# Altium footprint library CONNECTOR_JUMPER.PcbLib: 25 footprints (part 2 of 2)
Each footprint in its own frame and in the unit in brackets; x right, y up, seen from the top. Pads: shape width x height; smd on the part's side, far side on the other; paste and mask are expansions set on the pad; w line width, h text height; cw(c..) or ccw(c..) is an arc to the next point about the centre after c.
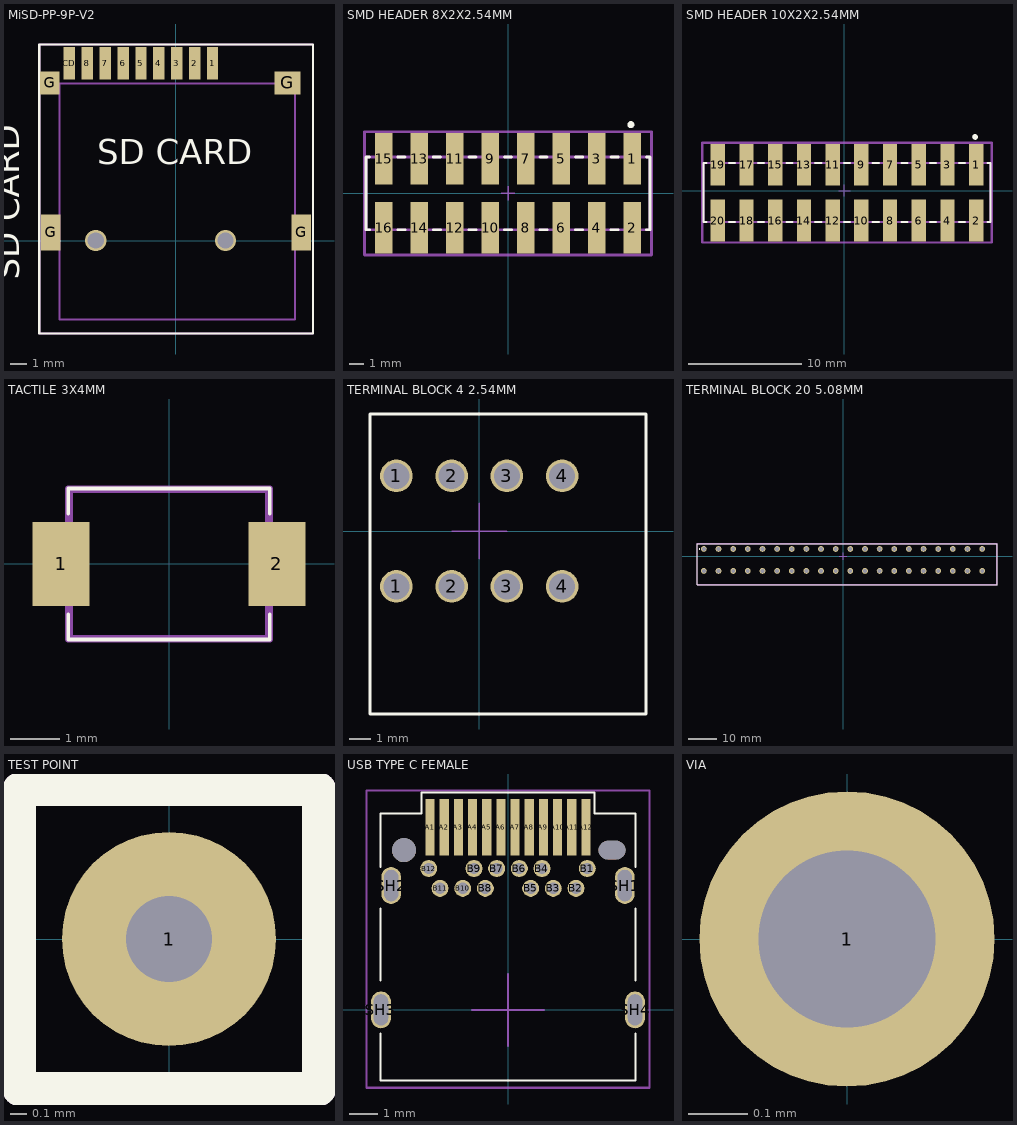
[diagram p1: the footprints below, top view; thin cyan lines are the x and y axes]

## MiSD-PP-9P-V2 [mm] "SD CARD"
pads (13):
  rect 0.7x2 smd mask+0.05: 1(2.25,10.9) 2(1.15,10.9) 3(0.05,10.9) 4(-1.05,10.9) 5(-2.15,10.9) 6(-3.25,10.9) 7(-4.35,10.9) 8(-5.45,10.9) CD(-6.55,10.9)
  rect 1.2x1.4 smd mask+0.05: G(-7.75,9.7)
  rect 1.2x2.2 smd mask+0.05: G(-7.7,0.5) G(7.7,0.5)
  rect 1.6x1.4 smd mask+0.05: G(6.85,9.7)
via 3.05,0 diameter 1.3 hole 1
via -4.93,0 diameter 1.3 hole 1
Top Overlay:
  lines w0.127: -8.407,-5.715 8.433,-5.715 8.433,12.065 -8.407,12.065 -8.407,-5.715
  text "SD CARD" at -4.826,4.699 h1.52
  text "SD CARD" at -9.652,-2.413 h1.52
Top 3D Body:
  lines w0.127: -7.163,-4.848 7.315,-4.848 7.315,9.652 -7.163,9.652 -7.163,-4.848
Mechanical 15:
  lines w0.127: -8.407,-5.715 8.433,-5.715 8.433,12.065 -8.407,12.065 -8.407,-5.715

## SMD HEADER 8X2X2.54MM [mm]
pads (16):
  rect 1.27x3.68 smd paste+0 mask+0: 1(8.89,2.475) 2(8.89,-2.475) 3(6.35,2.475) 4(6.35,-2.475) 5(3.81,2.475) 6(3.81,-2.475) 7(1.27,2.475) 8(1.27,-2.475) 9(-1.27,2.475) 10(-1.27,-2.475) 11(-3.81,2.475) 12(-3.81,-2.475) 13(-6.35,2.475) 14(-6.35,-2.475) 15(-8.89,2.475) 16(-8.89,-2.475)
Top Overlay:
  circle w0.25: c8.79,4.915 r0.125
  lines w0.2: -9.9,-2.605 -10.16,-2.605 -10.16,2.605 -9.9,2.605 ; -7.88,-2.605 -7.36,-2.605 ; -7.88,2.605 -7.36,2.605 ; -5.34,-2.605 -4.82,-2.605 ; -5.34,2.605 -4.82,2.605 ; -2.8,-2.605 -2.28,-2.605 ; -2.8,2.605 -2.28,2.605 ; -0.26,-2.605 0.26,-2.605 ; -0.26,2.605 0.26,2.605 ; 2.28,-2.605 2.8,-2.605 ; 2.28,2.605 2.8,2.605 ; 4.82,-2.605 5.34,-2.605 ; 4.82,2.605 5.34,2.605 ; 7.36,-2.605 7.88,-2.605 ; 7.36,2.605 7.88,2.605 ; 9.9,-2.605 10.16,-2.605 10.16,2.605 9.9,2.605
Top Courtyard:
  lines w0.2: -10.26,-4.415 10.26,-4.415 10.26,4.415 -10.26,4.415 -10.26,-4.415
Top Assembly:
  lines w0.2: -10.26,-4.415 10.26,-4.415 10.26,4.415 -10.26,4.415 -10.26,-4.415
  text ".Designator" at 0,0 h1
Top 3D Body:
  lines w0.2: -10.16,-2.605 10.16,-2.605 10.16,2.605 -10.16,2.605 -10.16,-2.605
Top Component Center:
  lines w0.1: -0.5,0 0.5,0 ; 0,-0.5 0,0.5
3D body "Conn_Samtec_TSM-108-01-S-DV-P-TR_eec.STEP": height 0.25, standoff 0, extent -10.26,-4.415 10.26,4.415

## SMD HEADER 10X2X2.54MM [mm]
pads (20):
  rect 1.27x3.68 smd paste+0 mask+0: 1(11.659,2.297) 2(11.659,-2.653) 3(9.119,2.297) 4(9.119,-2.653) 5(6.579,2.297) 6(6.579,-2.653) 7(4.039,2.297) 8(4.039,-2.653) 9(1.499,2.297) 10(1.499,-2.653) 11(-1.041,2.297) 12(-1.041,-2.653) 13(-3.581,2.297) 14(-3.581,-2.653) 15(-6.121,2.297) 16(-6.121,-2.653) 17(-8.661,2.297) 18(-8.661,-2.653) 19(-11.201,2.297) 20(-11.201,-2.653)
Top Overlay:
  circle w0.25: c11.559,4.737 r0.125
  lines w0.2: -12.211,-2.783 -12.471,-2.783 -12.471,2.427 -12.211,2.427 ; -10.191,-2.783 -9.671,-2.783 ; -10.191,2.427 -9.671,2.427 ; -7.651,-2.783 -7.131,-2.783 ; -7.651,2.427 -7.131,2.427 ; -5.111,-2.783 -4.591,-2.783 ; -5.111,2.427 -4.591,2.427 ; -2.571,-2.783 -2.051,-2.783 ; -2.571,2.427 -2.051,2.427 ; -0.031,-2.783 0.489,-2.783 ; -0.031,2.427 0.489,2.427 ; 2.509,-2.783 3.029,-2.783 ; 2.509,2.427 3.029,2.427 ; 5.049,-2.783 5.569,-2.783 ; 5.049,2.427 5.569,2.427 ; 7.849,-2.783 7.589,-2.783 8.109,-2.783 ; 7.849,2.427 7.589,2.427 8.109,2.427 ; 10.129,-2.783 10.649,-2.783 ; 10.129,2.427 10.649,2.427 ; 12.669,-2.783 12.929,-2.783 12.929,2.427 12.669,2.427
Top Courtyard:
  lines w0.2: 13.029,-4.593 13.029,4.237 ; 13.029,-4.593 -12.571,-4.593 -12.571,4.237 13.029,4.237 ; 13.029,-4.593 13.029,4.237
Top Assembly:
  lines w0.2: 13.029,-4.593 13.029,4.237 ; 13.029,-4.593 -12.571,-4.593 -12.571,4.237 13.029,4.237 ; 13.029,-4.593 13.029,4.237
  text ".Designator" at 0,0.188 h1
Top 3D Body:
  lines w0.2: 12.929,-2.783 12.929,2.427 ; -12.471,-2.783 -12.471,2.427 13.029,2.427 13.029,-2.783 -12.471,-2.783
Top Component Center:
  lines w0.1: -0.5,0 0.5,0 ; 0,-0.5 0,0.5
3D body "54202-G08-10A--3DModel-STEP-554624.STEP": height 9.65, standoff 0, extent -12.446,-3.71 12.954,3.66

## TACTILE 3X4MM [mm]
pads (2):
  rect 1.15x1.7 smd: 1(-2.175,0) 2(2.175,0)
Top Overlay:
  lines w0.076: -2.032,-1.016 -2.032,-1.524 2.032,-1.524 2.032,-1.016 ; -2.032,1.016 -2.032,1.524 2.032,1.524 2.032,1.016
Top Assembly:
  text ".Designator" at 0,0.188 h1
Top 3D Body:
  lines w0.127: -2,-1.5 2,-1.5 2,1.5 -2,1.5 -2,-1.5
Mechanical 15:
  lines w0.127: -2.032,-1.524 2.032,-1.524 2.032,1.524 -2.032,1.524 -2.032,-1.524
3D body: height 2, standoff 0, extent -0.875,-0.875 0.875,0.875
3D body: height 1.5, standoff 0, extent -2.032,-1.524 2.032,1.524
3D body: height 0.2, standoff 0, extent 1.524,-0.762 2.54,0.762
3D body: height 0.2, standoff 0, extent -2.54,-0.762 -1.524,0.762

## TERMINAL BLOCK 4 2.54MM [mm]
pads (8):
  round 1.5 hole 1.2: 1(-3.81,-2.54) 1(-3.81,2.54) 2(-1.27,-2.54) 2(-1.27,2.54) 3(1.27,-2.54) 3(1.27,2.54) 4(3.81,-2.54) 4(3.81,2.54)
Top Overlay:
  lines w0.127: -5.029,-8.407 -5.029,5.385 7.671,5.385 7.671,-8.407 -5.029,-8.407
Top Assembly:
  text ".Designator" at 0,0.188 h1
Top 3D Body:
  lines w0.025: -5.029,-8.407 -5.029,5.385 7.671,5.385 7.671,-8.407 -5.029,-8.407
Mechanical 15:
  lines w0.025: -5.029,-8.407 7.671,-8.407 7.671,5.385 -5.029,5.385 -5.029,-8.407
Top Component Center:
  lines w0.076: -1.27,0 1.27,0 ; 0,-1.27 0,1.27
3D body "KF141R-2.54-4P.step": height 12.5, standoff -3.5, extent -5.029,-8.407 7.671,5.393

## TERMINAL BLOCK 20 5.08MM [mm]
pads (40):
  round 2 hole 1.3: 1(-48.26,-5.08) 1(-48.26,2.54) 2(-43.18,-5.08) 2(-43.18,2.54) 3(-38.1,-5.08) 3(-38.1,2.54) 4(-33.02,-5.08) 4(-33.02,2.54) 5(-27.94,-5.08) 5(-27.94,2.54) 6(-22.86,-5.08) 6(-22.86,2.54) 7(-17.78,-5.08) 7(-17.78,2.54) 8(-12.7,-5.08) 8(-12.7,2.54) 9(-7.62,-5.08) 9(-7.62,2.54) 10(-2.54,-5.08) 10(-2.54,2.54) 11(2.54,-5.08) 11(2.54,2.54) 12(7.62,-5.08) 12(7.62,2.54) 13(12.7,-5.08) 13(12.7,2.54) 14(17.78,-5.08) 14(17.78,2.54) 15(22.86,-5.08) 15(22.86,2.54) 16(27.94,-5.08) 16(27.94,2.54) 17(33.02,-5.08) 17(33.02,2.54) 18(38.1,-5.08) 18(38.1,2.54) 19(43.18,-5.08) 19(43.18,2.54) 20(48.26,-5.08) 20(48.26,2.54)
Top Overlay:
  circle w0.254: c-49.759,2.515 r0.13
  lines w0.127: -50.622,-9.83 53.416,-9.83 53.416,4.293 -50.622,4.293 -50.622,-9.83
Top Assembly:
  text ".Designator" at 0,0.188 h1
Top 3D Body:
  lines w0.025: -50.648,-9.779 53.391,-9.779 53.391,4.343 -50.648,4.343 -50.648,-9.779
Mechanical 15:
  lines w0.127: -50.622,-9.83 53.416,-9.83 53.416,4.47 -50.622,4.47 -50.622,-9.83
Top Component Center:
  lines w0.076: -1.27,0 1.27,0 ; 0,-1.27 0,1.27
3D body "User Library-KF142R-5_08-MultiConfig.sldprt": height 13.4, standoff -3.5, extent -50.648,-9.768 53.392,4.332

## TEST POINT [mil]
pads (1):
  round 50 hole 20 mask+1.97: 1(0,0)
Top Overlay:
  lines w7.87: -35,-35 35,-35 35,35 -35,35 -35,-35
  text ".Comment" at 40,-14.59 h39.37
Top Courtyard:
  lines w7.87: -35,-35 35,-35 35,35 -35,35 -35,-35
Top Assembly:
  lines w7.87: -35,-35 35,-35 35,35 -35,35 -35,-35
  text ".Designator" at 0,7.4 h39.37
Top 3D Body:
  lines w7.87: -35,-35 35,-35 35,35 -35,35 -35,-35
Top Component Center:
  lines w3.94: -19.68,0 19.68,0 ; 0,-19.68 0,19.68

## USB TYPE C FEMALE [mm]
pads (30):
  rect 0.32x2 smd mask+0.05: A1(-2.75,6.45) A2(-2.25,6.45) A3(-1.75,6.45) A4(-1.25,6.45) A5(-0.75,6.45) A6(-0.25,6.45) A7(0.25,6.45) A8(0.75,6.45) A9(1.25,6.45) A10(1.75,6.45) A11(2.25,6.45) A12(2.75,6.45)
  round 0.6 hole 0.4 mask+0.05: B1(2.8,4.99) B2(2.4,4.29) B3(1.6,4.29) B4(1.2,4.99) B5(0.8,4.29) B6(0.4,4.99) B7(-0.4,4.99) B8(-0.8,4.29) B9(-1.2,4.99) B10(-1.6,4.29) B11(-2.4,4.29) B12(-2.8,4.99)
  oval 0.7x1.3 hole 0.5 slot 1.1 at 90 deg: SH1(4.125,4.39) SH2(-4.125,4.39) SH3(-4.485,0) SH4(4.485,0)
  round 0.85 hole 0.85 unplated: ""(-3.675,5.64)
  oval 0.95x0.65 hole 0.65 slot 0.95 at 0 deg unplated: ""(3.675,5.64)
Top Overlay:
  lines w0.076: -4.496,-0.838 -4.496,-2.489 4.496,-2.489 4.496,-0.838 ; -4.496,1.041 -4.496,3.581 ; -4.496,5.055 -4.496,6.934 -3.048,6.934 -3.048,7.671 3.048,7.671 3.048,6.934 4.496,6.934 4.496,5.055 ; 4.496,1.041 4.496,3.581
Top Assembly:
  text ".Designator" at 0,0.188 h1
Mechanical 15:
  lines w0.076: -5,-2.75 5,-2.75 5,7.75 -5,7.75 -5,-2.75
Top Component Center:
  lines w0.076: -1.27,0 1.27,0 ; 0,-1.27 0,1.27
Multi-Layer:
  pour cut-out: -5.08,7.798 5.08,7.798 5.08,-2.794 -5.08,-2.794
3D body "CUI_DEVICES_UJ31-CH-3-SMT-TR.step": height 3.13, standoff -0.93, extent -4.48,-2.45 4.48,6.9

## VIA [mm]
pads (1):
  round 0.5 hole 0.3: 1(0,0)